# Altium footprint library Audio-Beamformer.PcbLib: 47 footprints (part 2 of 3)
Each footprint in its own frame and in the unit in brackets; x right, y up, seen from the top. Pads: shape width x height; smd on the part's side, far side on the other; paste and mask are expansions set on the pad; w line width, h text height; cw(c..) or ccw(c..) is an arc to the next point about the centre after c.
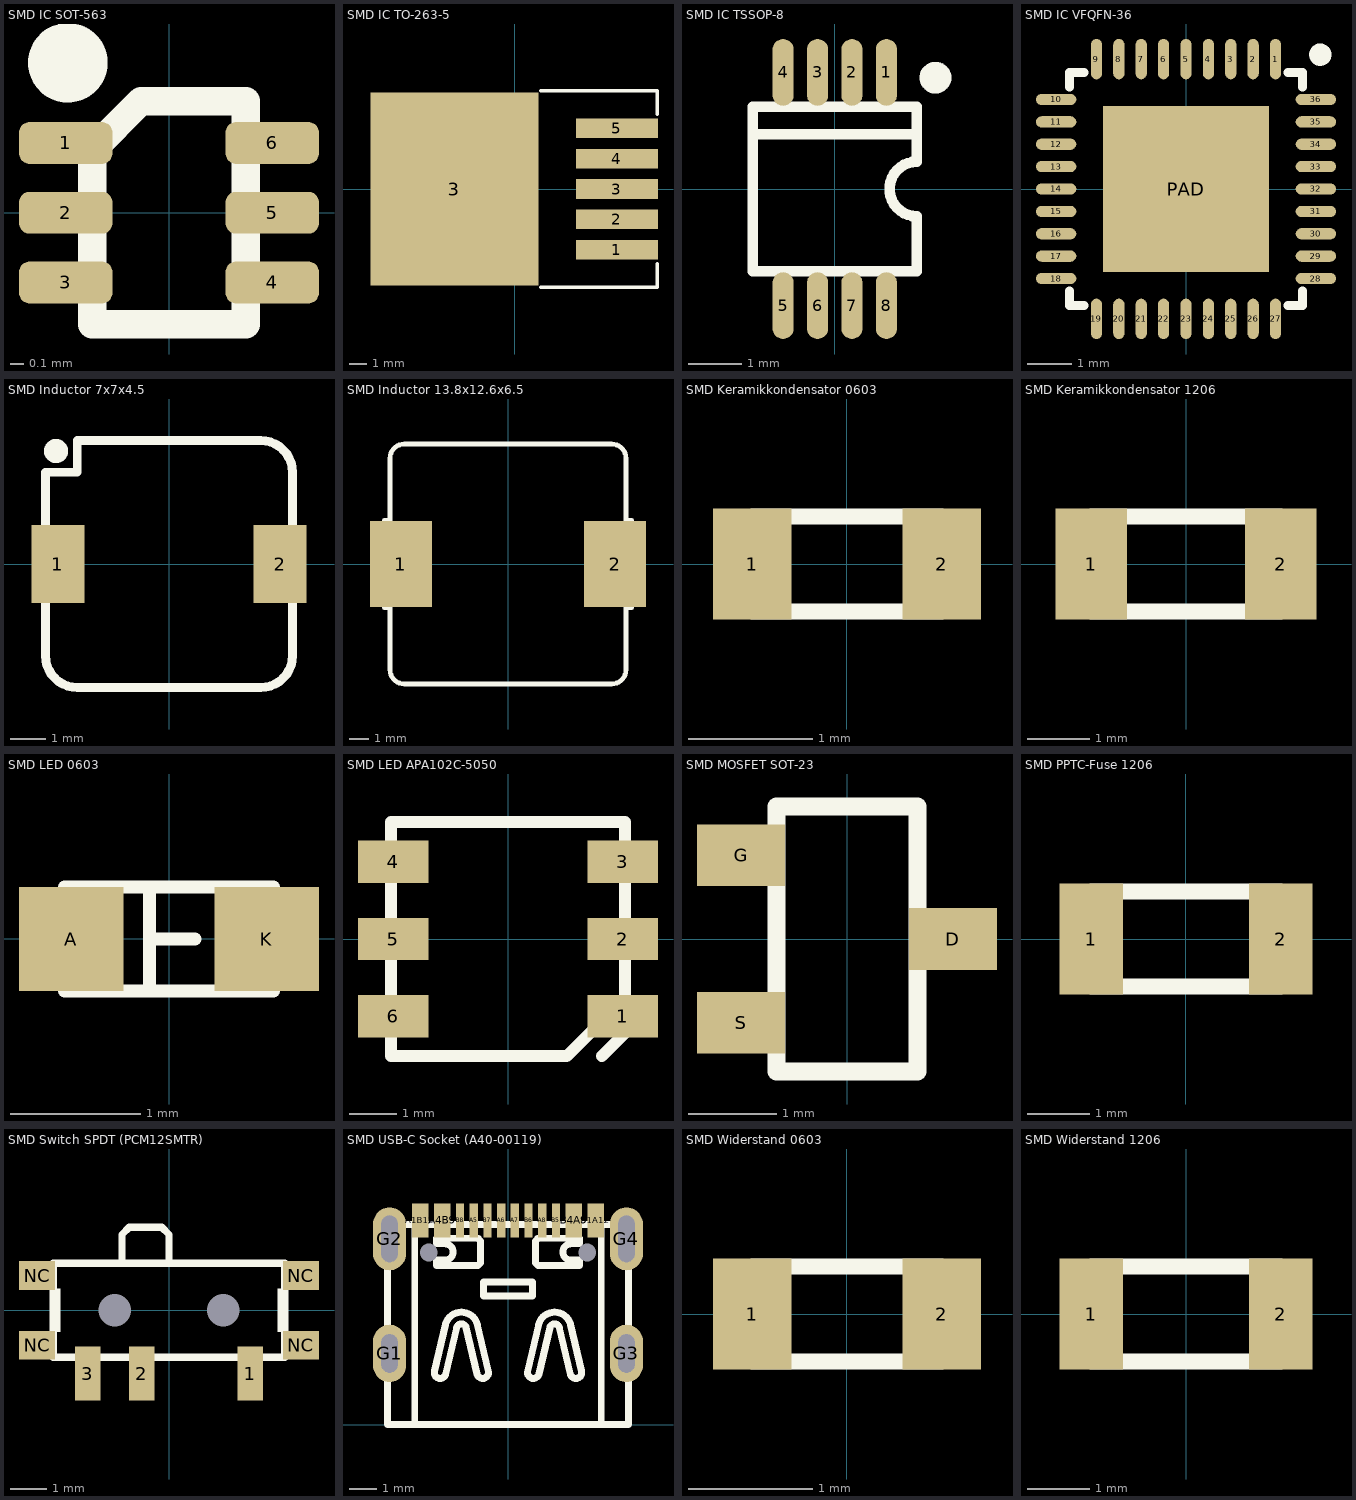
[diagram p1: the footprints below, top view; thin cyan lines are the x and y axes]

## SMD IC SOT-563 [mm]
pads (6):
  rrect50% 0.67x0.3 smd: 1(-0.74,0.5) 2(-0.74,0) 3(-0.74,-0.5) 4(0.74,-0.5) 5(0.74,0) 6(0.74,0.5)
Top Overlay:
  circle w0.37: c-0.725,1.075 r0.1
  lines w0.203: -0.55,-0.8 -0.55,0.45 -0.2,0.8 0.55,0.8 0.55,-0.8 -0.55,-0.8
3D body "User Library-SOT-563.x_b": height 0.58, standoff 0, extent -0.813,-0.8 0.813,0.8

## SMD IC TO-263-5 [mm]
pads (6):
  rect 4.6x1.1 smd: 1(5.725,-3.4) 2(5.725,-1.7) 3(5.725,0) 4(5.725,1.7) 5(5.725,3.4)
  rect 9.4x10.8 smd: 3(-3.375,0)
Top Overlay:
  lines w0.2: 1.475,-5.5 7.975,-5.5 7.975,-4.191 ; 1.475,5.5 7.975,5.5 7.975,4.191
3D body "User Library-TO263-5.X_B": height 4.78, standoff -0.02, extent -7.83,-5 7.84,5

## SMD IC TSSOP-8 [mm] "Shrink Small Outline; 16 Leads; Body Width 4.4 mm; Pitch 0.65 mm"
height 1.1
pads (8):
  oval 0.4x1.26 smd: 1(0.975,2.2) 2(0.325,2.2) 3(-0.325,2.2) 4(-0.975,2.2) 5(-0.975,-2.2) 6(-0.325,-2.2) 7(0.325,-2.2) 8(0.975,-2.2)
Top Overlay:
  circle w0.35: c1.9,2.1 r0.125
  lines w0.2: -1.55,1.033 1.55,1.033 ; -1.55,-1.55 1.55,-1.55 1.55,-0.517 cw(c1.55,0) 1.55,0.517 1.55,1.55 -1.55,1.55 -1.55,-1.55
3D body "User Library-TSSOP-8 3_1x3_1.X_T": height 1.07, standoff -0.03, extent -1.55,-2.5 1.55,2.5

## SMD IC VFQFN-36 [mm]
pads (37):
  oval 0.25x0.9 smd: 1(2,2.9) 2(1.5,2.9) 3(1,2.9) 4(0.5,2.9) 5(0,2.9) 6(-0.5,2.9) 7(-1,2.9) 8(-1.5,2.9) 9(-2,2.9) 19(-2,-2.9) 20(-1.5,-2.9) 21(-1,-2.9) 22(-0.5,-2.9) 23(0,-2.9) 24(0.5,-2.9) 25(1,-2.9) 26(1.5,-2.9) 27(2,-2.9)
  oval 0.9x0.25 smd: 10(-2.9,2) 11(-2.9,1.5) 12(-2.9,1) 13(-2.9,0.5) 14(-2.9,0) 15(-2.9,-0.5) 16(-2.9,-1) 17(-2.9,-1.5) 18(-2.9,-2) 28(2.9,-2) 29(2.9,-1.5) 30(2.9,-1) 31(2.9,-0.5) 32(2.9,0) 33(2.9,0.5) 34(2.9,1) 35(2.9,1.5) 36(2.9,2)
  rect 3.7x3.7 smd: PAD(0,0)
Top Overlay:
  circle w0.25: c3,3 r0.125
  lines w0.2: -2.6,-2.275 -2.6,-2.6 -2.275,-2.6 ; -2.6,2.275 -2.6,2.6 -2.275,2.6 ; 2.275,-2.6 2.6,-2.6 2.6,-2.275 ; 2.275,2.6 2.6,2.6 2.6,2.275
3D body "QFN-36.stp": height 1.07, standoff 0, extent -3,-3 3,3

## SMD Inductor 7x7x4.5 [mm]
pads (2):
  rect 1.5x2.2 smd: 1(-3.15,0) 2(3.15,0)
Top Overlay:
  circle w0.4: c-3.2,3.2 r0.141
  lines w0.254: -3.5,-2.6 ccw(c-2.6,-2.6) -2.6,-3.5 2.6,-3.5 ccw(c2.6,-2.6) 3.5,-2.6 3.5,2.6 ccw(c2.6,2.6) 2.6,3.5 -2.6,3.5 -2.6,2.6 -3.5,2.6 -3.5,-2.6
3D body "User Library-Coil.x_t": height 4.61, standoff 0, extent -3.6,-3.5 3.6,3.5

## SMD Inductor 13.8x12.6x6.5 [mm]
pads (2):
  rect 3.25x4.5 smd: 1(-5.625,0) 2(5.625,0)
Top Overlay:
  lines w0.254: -6.2,-2.3 -6.5,-2.3 -6.5,0 -6.5,2.3 -6.2,2.3 ; 6.2,-2.3 6.5,-2.3 6.5,0 6.5,2.3 6.2,2.3 ; -6.201,0 -6.195,-5.55 ccw(c-5.45,-5.55) -5.45,-6.295 0,-6.301 5.45,-6.295 ccw(c5.45,-5.55) 6.195,-5.55 6.201,0 6.195,5.55 ccw(c5.45,5.55) 5.45,6.295 0,6.301 -5.45,6.295 ccw(c-5.45,5.55) -6.195,5.55 -6.201,0
3D body "User Library-SRP1265A.x_b": height 6.35, standoff 0.05, extent -6.45,-6.15 6.4,6.35

## SMD Keramikkondensator 0603 [mil]
height 66.93
pads (2):
  rect 25x35 smd: 1(-30,0) 2(30,0)
Top Overlay:
  lines w5: -30,-15 -30,15 30,15 30,-15 -30,-15
3D body "User Library-0603_Cap.STEP": height 31.69, standoff 0, extent -31.49,-15.74 31.5,15.75

## SMD Keramikkondensator 1206 [mil]
pads (2):
  rect 45x70 smd: 1(-60,0) 2(60,0)
Top Overlay:
  lines w10: -60,-30 60,-30 60,30 -60,30 -60,-30
3D body "User Library-1206 SMD Capacitor.step": height 39.45, standoff 0, extent -62.98,-31.49 63,31.51

## SMD LED 0603 [mm] "SMD_LED_RED"
height 8.65
pads (2):
  rect 0.8x0.8 smd: A(-0.75,0) K(0.75,0)
Top Overlay:
  lines w0.1: -0.15,-0.4 -0.15,0.4 ; -0.15,0 0.2,0 ; -0.8,-0.4 -0.8,0.4 0.8,0.4 0.8,-0.4 -0.8,-0.4
3D body "User Library-LED SMD0603.step": height 0.68, standoff 0, extent -0.808,-0.368 0.842,0.357

## SMD LED APA102C-5050 [mm] "SMD_LED_RED"
height 8.65
pads (6):
  rect 1.5x0.9 smd: 1(2.45,-1.65) 2(2.45,0) 3(2.45,1.65) 4(-2.45,1.65) 5(-2.45,0) 6(-2.45,-1.65)
Top Overlay:
  lines w0.254: 2,-2.5 2.5,-2 ; -2.5,-2.5 1.25,-2.5 2.5,-1.25 2.5,2.5 -2.5,2.5 -2.5,-2.5
3D body "APA102C.STEP": height 1.58, standoff 0.03, extent -2.75,-2.5 2.75,2.5

## SMD MOSFET SOT-23 [mm]
pads (3):
  rect 1x0.7 smd: D(1.2,0) G(-1.2,0.95) S(-1.2,-0.95)
Top Overlay:
  lines w0.203: -0.8,-1.5 -0.8,1.5 0.8,1.5 0.8,-1.5 -0.8,-1.5
3D body "CircuitWorks-SOT-23.step": height 1.1, standoff 0, extent -1.301,-1.5 1.199,1.5

## SMD PPTC-Fuse 1206 [mil]
height 66.93
pads (2):
  rect 40x70 smd: 1(-60,0) 2(60,0)
Top Overlay:
  lines w10: -60,-30 -60,30 60,30 60,-30 -60,-30
3D body "User Library-Fuse1206.step": height 22.44, standoff -0.39, extent -63.03,-32.88 63.03,32.87

## SMD Switch SPDT (PCM12SMTR) [mm]
pads (9):
  rect 0.7x1.5 smd: 1(2.25,-1.75) 2(-0.75,-1.75) 3(-2.25,-1.75)
  rect 1x0.8 smd: NC(-3.65,-0.965) NC(-3.65,0.965) NC(3.65,-0.965) NC(3.65,0.965)
  round 0 hole 0.9 unplated: NC(-1.5,0) NC(1.5,0)
Top Overlay:
  rectangle: -3.2,-0.6 -3,0.6
  region: 3.2,0.6 3,0.6 3,-0.6 3.2,-0.6
  lines w0.203: -1.3,1.3 -1.3,2.1 -1.1,2.3 -0.2,2.3 0,2.1 0,1.3 ; 0,1.3 -3.2,1.3 -3.2,-1.3 0,-1.3 3.2,-1.3 3.2,1.3 0,1.3
3D body "User Library-pcm12smtr.STEP": height 1.4, standoff -0.5, extent -3.673,-2.23 3.681,2.345

## SMD USB-C Socket (A40-00119) [mm]
pads (18):
  rect 0.6x1.25 smd: A1B12(-3.2,7.45) A4B9(-2.4,7.45) B1A12(3.2,7.45) B4A9(2.4,7.45)
  rect 0.3x1.25 smd: A5(-1.25,7.45) A6(-0.25,7.45) A7(0.25,7.45) A8(1.25,7.45) B5(1.75,7.45) B6(0.75,7.45) B7(-0.75,7.45) B8(-1.75,7.45)
  oval 1.2x2.1 hole 0.6 slot 1.4 at 90 deg: G1(-4.32,2.6) G3(4.32,2.6)
  oval 1.2x2.3 hole 0.6 slot 1.7 at 90 deg: G2(-4.32,6.78) G4(4.32,6.78)
  round 0 hole 0.65 unplated: NC(-2.89,6.28) NC(2.89,6.28)
Top Overlay:
  lines w0.254: -3.5,0 -3.4,0 -3.4,7.3 ; 3.4,7.3 3.4,0 3.5,0 ; -4.4,0 -4.375,0 0,0 4.375,0 4.4,0 4.4,7.3 0,7.3 -4.4,7.3 -4.4,0 ; -2.68,1.965 ccw(c-2.476,1.902) -2.27,1.85 -1.871,3.547 cw(c-1.7,3.5) -1.7,3.677 cw(c-1.7,3.5) -1.529,3.547 -1.13,1.85 ccw(c-0.924,1.902) -0.72,1.965 -1.12,3.662 ccw(c-1.7,3.5) -1.7,4.102 ccw(c-1.7,3.5) -2.28,3.662 -2.68,1.965 ; -2.6,5.8 -2.6,6 -2.3,6 ccw(c-2.3,6.3) -2,6.3 ccw(c-2.3,6.3) -2.3,6.6 -2.6,6.6 -2.6,6.8 -1.1,6.8 -1,6.7 -1,5.9 -1.1,5.8 -2.6,5.8 ; -0.9,4.7 -0.9,5.2 0,5.2 0.9,5.2 0.9,4.7 0,4.7 -0.9,4.7 ; 0.72,1.965 ccw(c0.924,1.902) 1.13,1.85 1.529,3.547 cw(c1.7,3.5) 1.7,3.677 cw(c1.7,3.5) 1.871,3.547 2.27,1.85 ccw(c2.476,1.902) 2.68,1.965 2.28,3.662 ccw(c1.7,3.5) 1.7,4.102 ccw(c1.7,3.5) 1.12,3.662 0.72,1.965 ; 1,5.9 1.1,5.8 2.6,5.8 2.6,6 2.3,6 cw(c2.3,6.3) 2,6.3 cw(c2.3,6.3) 2.3,6.6 2.6,6.6 2.6,6.8 1.1,6.8 1,6.7 1,5.9
3D body "USB - C.x_t": height 3.26, standoff -1, extent -4.475,0 4.475,7.75

## SMD Widerstand 0603 [mil]
height 66.93
pads (2):
  rect 25x35 smd: 1(-30,0) 2(30,0)
Top Overlay:
  lines w5: -30,-15 -30,15 30,15 30,-15 -30,-15
3D body "User Library-Panasonic0603.step": height 17.72, standoff 0, extent -31.5,-16.14 31.5,16.14

## SMD Widerstand 1206 [mil]
pads (2):
  rect 40x70 smd: 1(-60,0) 2(60,0)
Top Overlay:
  lines w10: -60,-30 60,-30 60,30 -60,30 -60,-30
3D body "User Library-R SMD 1206.STEP": height 22.14, standoff 0.49, extent -63.28,-31.49 62.7,31.51